# Altium schematic symbol library Semi-ATE.SchLib: 322 symbols (part 2 of 6) (continued)
## CAP_8 (continued)
CAP CER 22UF 10V X5R 0805; 04. Manufacturer: Samsung Electro-Mechanics; 07. Manufacturer  Part Number: CL21A226KPCLRNC; Parameters: X5R, 10V, 10%; POPULATED: yes; 03. Unit Price: 0.36; Tolerance: 10%; 3D-Export: No; 01. Distributor: DigiKey; 02. Distributor Part Number: 1276-6786-6-ND; 09. Operating Temperature: -55°C ~ 85°C; 11. RoHS: YES; Temperature Range: -40°C/+85°C; Type: X5R; Voltage Rating: 10V; ComponentLink4Description: Info; ComponentLink4URL: https://www.digikey.de/products/en/capacitors/ceramic-capacitors/60?k=&pkeyword=&sv=0&pv7=243&sf=1&FV=380004%2C400006%2C1f140000%2Cmu22%C2%B5F%7C2049%2Cffe0003c%2Cc0003&quantity=&ColumnSort=0&page=1&pageSize=25; ComponentLink5Description: DataSheet; ComponentLink5URL: http://www.samsungsem.com/kr/support/product-search/mlcc/CL21A226KPCLRNC.jsp
footprint C0805 (Chip Capacitor; Body 2.0x1.3mm (LxW typ), IPC High Density)
signal-integrity model Cap
simulation model CAP
footprint C1206
footprint C0805 Reflow
pins: 1, 2
2 alternate drawings of the same symbol

## CAP_9
designator C?, comment value 10nF  (hidden comment: C)
CAP CER 10000PF 10V X7R 0402; 04. Manufacturer: KEMET; 07. Manufacturer  Part Number: C0402C103K8RACTU; POPULATED: yes; Parameters: X7R, 10V, 10%; 03. Unit Price: 0.09; Tolerance: 10%; 3D-Export: No; 01. Distributor: DigiKey; 02. Distributor Part Number: 399-7759-6-ND; 09. Operating Temperature: -55°C ~ 125°C; 11. RoHS: YES; Temperature Range: -40°C/+85°C; Type: X7R; Voltage Rating: 10V; ComponentLink4Description: Info; ComponentLink4URL: https://www.digikey.de/product-detail/en/kemet/C0402C103K8RACTU/399-7759-6-ND/3472290; ComponentLink5Description: DataSheet; ComponentLink5URL: https://content.kemet.com/datasheets/KEM_C1002_X7R_SMD.pdf
footprint C0603 (Chip Capacitor; Body 1.6x0.8mm (LxW typ), IPC High Density)
footprint C0805 (Chip Capacitor; Body 2.0x1.3mm (LxW typ), IPC High Density)
footprint C1206 (Chip Capacitor; Body 3.2x1.6mm (LxW typ), IPC High Density)
footprint C1210 (Chip Capacitor; Body 3.2x2.5mm (LxW typ), IPC High Density)
footprint C1812 (Chip Capacitor; Body 4.5x3.2mm (LxW typ), IPC High Density)
footprint C1825 (Chip Capacitor; Body 4.5x6.4mm (LxW typ), IPC High Density)
footprint C0402 (Chip Capacitor; Body 1.0x0.5mm (LxW typ), IPC High Density)
signal-integrity model Cap
simulation model CAP
footprint C0402 RevOne
pins: 1, 2
2 alternate drawings of the same symbol

## CAP_10
designator C?, comment value 1uF  (hidden comment: C)
CAP CER 1UF 25V X5R 0402; 04. Manufacturer: TDK Corporation; 07. Manufacturer  Part Number: CGB2A1X5R1E105K033BC; POPULATED: yes; Parameters: X5R, 25V, 10%; 03. Unit Price: 0.2; Tolerance: 10%; 3D-Export: No; 01. Distributor: DigiKey; 02. Distributor Part Number: 445-13185-6-ND; 09. Operating Temperature: -55°C ~ 85°C; 11. RoHS: YES; Temperature Range: -55°C ~ 85°C; Type: X5R; Voltage Rating: 25V; ComponentLink4Description: Info; ComponentLink4URL: https://www.digikey.de/product-detail/en/tdk-corporation/CGB2A1X5R1E105K033BC/445-13185-6-ND/3959281
footprint C0603 (Chip Capacitor; Body 1.6x0.8mm (LxW typ), IPC High Density)
footprint C0805 (Chip Capacitor; Body 2.0x1.3mm (LxW typ), IPC High Density)
footprint C1206 (Chip Capacitor; Body 3.2x1.6mm (LxW typ), IPC High Density)
footprint C1210 (Chip Capacitor; Body 3.2x2.5mm (LxW typ), IPC High Density)
footprint C1812 (Chip Capacitor; Body 4.5x3.2mm (LxW typ), IPC High Density)
footprint C1825 (Chip Capacitor; Body 4.5x6.4mm (LxW typ), IPC High Density)
footprint C0402 (Chip Capacitor; Body 1.0x0.5mm (LxW typ), IPC High Density)
signal-integrity model Cap
simulation model CAP
footprint C0402 RevOne
pins: 1, 2
2 alternate drawings of the same symbol

## CAP_11
designator C?, comment value 4.7uF  (hidden comment: C)
CAP CER 4.7UF 25V X7R 0805; 04. Manufacturer: TDK Corporation; 07. Manufacturer  Part Number: CGA4J1X7R1E475K125AC; POPULATED: yes; Parameters: X7R, 25V, 10%; 03. Unit Price: 0.5; Tolerance: 10%; 3D-Export: No; 01. Distributor: DigiKey; 02. Distributor Part Number: 445-6967-6-ND; 09. Operating Temperature: -55°C ~ 125°C; 11. RoHS: YES; Temperature Range: -55°C ~ 125°C; Type: X7R; Voltage Rating: 25V; ComponentLink5Description: Info; ComponentLink5URL: https://www.digikey.de/product-detail/en/tdk-corporation/CGA4J1X7R1E475K125AC/445-6967-6-ND/2673110
footprint C0805 (Chip Capacitor; Body 2.0x1.3mm (LxW typ), IPC High Density)
signal-integrity model Cap
simulation model CAP
footprint C0805 Reflow
pins: 1, 2
2 alternate drawings of the same symbol

## CAP_12
designator C?, comment value 100nF  (hidden comment: C)
CAP CER 0.1UF 25V X7R 0603; 04. Manufacturer: Samsung Electro-Mechanics; 07. Manufacturer  Part Number: CL10B104KA8NNNC; POPULATED: yes; Parameters: X7R, 25V, 10%; 03. Unit Price: 0.09; Tolerance: 10%; 3D-Export: No; 01. Distributor: DigiKey; 02. Distributor Part Number: 1276-1006-6-ND; 09. Operating Temperature: -55°C ~ 125°C; 11. RoHS: YES; Temperature Range: -40°C/+85°C; Type: X7R; Voltage Rating: 25V; ComponentLink4Description: Info; ComponentLink4URL: https://www.digikey.de/product-detail/en/samsung-electro-mechanics/CL10B104KA8NNNC/1276-1006-6-ND/3891520; ComponentLink5Description: DataSheet; ComponentLink5URL: https://media.digikey.com/pdf/Data%20Sheets/Samsung%20PDFs/CL_Series_MLCC_ds.pdf
footprint C0402 (Chip Capacitor; Body 1.0x0.5mm (LxW typ), IPC High Density)
footprint C0603 (Chip Capacitor; Body 1.6x0.8mm (LxW typ), IPC High Density)
footprint C0805 (Chip Capacitor; Body 2.0x1.3mm (LxW typ), IPC High Density)
footprint C1206 (Chip Capacitor; Body 3.2x1.6mm (LxW typ), IPC High Density)
footprint C1210 (Chip Capacitor; Body 3.2x2.5mm (LxW typ), IPC High Density)
footprint C1812 (Chip Capacitor; Body 4.5x3.2mm (LxW typ), IPC High Density)
footprint C1825 (Chip Capacitor; Body 4.5x6.4mm (LxW typ), IPC High Density)
signal-integrity model Cap
simulation model CAP
footprint C0603 Reflow
pins: 1, 2
2 alternate drawings of the same symbol

## CAP_13
designator C?, comment value 100nF  (hidden comment: C)
CAP CER 0.1UF 25V X7R 0402; 04. Manufacturer: Yageo; 07. Manufacturer  Part Number: CC0402KRX7R8BB104; POPULATED: yes; Parameters: X7R, 25V, 10%; 03. Unit Price: 0.09; Tolerance: 10%; 3D-Export: No; 01. Distributor: DigiKey; 02. Distributor Part Number: 311-2077-6-ND; 09. Operating Temperature: -55°C ~ 125°C; 11. RoHS: YES; Temperature Range: -40°C/+85°C; Type: X7R; Voltage Rating: 25V
footprint C0402 (Chip Capacitor; Body 1.0x0.5mm (LxW typ), IPC High Density)
footprint C0603 (Chip Capacitor; Body 1.6x0.8mm (LxW typ), IPC High Density)
footprint C0805 (Chip Capacitor; Body 2.0x1.3mm (LxW typ), IPC High Density)
footprint C1206 (Chip Capacitor; Body 3.2x1.6mm (LxW typ), IPC High Density)
footprint C1210 (Chip Capacitor; Body 3.2x2.5mm (LxW typ), IPC High Density)
footprint C1812 (Chip Capacitor; Body 4.5x3.2mm (LxW typ), IPC High Density)
footprint C1825 (Chip Capacitor; Body 4.5x6.4mm (LxW typ), IPC High Density)
signal-integrity model Cap
simulation model CAP
footprint C0402 RevOne
pins: 1, 2
2 alternate drawings of the same symbol

## CAP_14
designator C?, comment value 2.2nF  (hidden comment: C)
CAP CER 2200PF 25V X7R 0603; 04. Manufacturer: KEMET; 07. Manufacturer  Part Number: C0603C222K3RACTU; POPULATED: yes; Parameters: X7R, 25V, 10%; 03. Unit Price: 0.09; Tolerance: 10%; 3D-Export: No; 01. Distributor: DigiKey; 02. Distributor Part Number: 399-9040-6-ND; 09. Operating Temperature: -55°C ~ 125°C; 11. RoHS: YES; Temperature Range: -40°C/+85°C; Type: X7R; Voltage Rating: 25V; ComponentLink4Description: Info; ComponentLink4URL: https://www.digikey.de/product-detail/en/kemet/C0603C222K3RACTU/399-9040-6-ND/3523110
footprint C0402 (Chip Capacitor; Body 1.0x0.5mm (LxW typ), IPC High Density)
footprint C0603 (Chip Capacitor; Body 1.6x0.8mm (LxW typ), IPC High Density)
footprint C0805 (Chip Capacitor; Body 2.0x1.3mm (LxW typ), IPC High Density)
footprint C1206 (Chip Capacitor; Body 3.2x1.6mm (LxW typ), IPC High Density)
footprint C1210 (Chip Capacitor; Body 3.2x2.5mm (LxW typ), IPC High Density)
footprint C1812 (Chip Capacitor; Body 4.5x3.2mm (LxW typ), IPC High Density)
footprint C1825 (Chip Capacitor; Body 4.5x6.4mm (LxW typ), IPC High Density)
signal-integrity model Cap
simulation model CAP
footprint C0603 Reflow
pins: 1, 2
2 alternate drawings of the same symbol

## CAP_15
designator C?, comment value 100nF  (hidden comment: C)
CAP CER 0.1UF 25V X7R 0805; 04. Manufacturer: Yageo; 07. Manufacturer  Part Number: CC0805KRX7R8BB104; POPULATED: yes; Parameters: X7R, 25V, 10%; 03. Unit Price: 0.14; Tolerance: 10%; 3D-Export: No; 01. Distributor: DigiKey; 02. Distributor Part Number: 311-1141-6-ND; 09. Operating Temperature: -55°C ~ 125°C; 11. RoHS: YES; Temperature Range: -40°C/+85°C; Type: X7R; Voltage Rating: 25V; ComponentLink4Description: Info; ComponentLink4URL: https://www.digikey.de/product-detail/en/yageo/CC0805KRX7R8BB104/311-1141-6-ND/578995; ComponentLink5Description: DataSheet; ComponentLink5URL: http://www.yageo.com/documents/recent/UPY-GPHC_X7R_6.3V-to-50V_18.pdf
footprint C0402 (Chip Capacitor; Body 1.0x0.5mm (LxW typ), IPC High Density)
footprint C0603 (Chip Capacitor; Body 1.6x0.8mm (LxW typ), IPC High Density)
footprint C0805 (Chip Capacitor; Body 2.0x1.3mm (LxW typ), IPC High Density)
footprint C1206 (Chip Capacitor; Body 3.2x1.6mm (LxW typ), IPC High Density)
footprint C1210 (Chip Capacitor; Body 3.2x2.5mm (LxW typ), IPC High Density)
footprint C1812 (Chip Capacitor; Body 4.5x3.2mm (LxW typ), IPC High Density)
footprint C1825 (Chip Capacitor; Body 4.5x6.4mm (LxW typ), IPC High Density)
signal-integrity model Cap
simulation model CAP
footprint C0805 Reflow
pins: 1, 2
2 alternate drawings of the same symbol

## CAP_16
designator C?, comment value 47uF  (hidden comment: C)
CAP CER 47UF 10V X5R 1210; MFR-PN: GRM32ER71A476KE15L; MFR: MURATA; MFR-TYPE: GRM series; 04. Manufacturer: Samsung Electro-Mechanics; 07. Manufacturer  Part Number: CL32A476MPJNNNE; POPULATED: yes; Parameters: X7R, 10V, 10%; 03. Unit Price: 0.87; Tolerance: ±20%; Type: X7R; 3D-Export: No; Temperature Range: -55°C ~ 85°C; 01. Distributor: DigiKey; 02. Distributor Part Number: 1276-3380-6-ND; 09. Operating Temperature: -55°C ~ 85°C; 11. RoHS: YES; Voltage Rating: 10V; ComponentLink4Description: Info; ComponentLink4URL: https://www.digikey.de/product-detail/en/samsung-electro-mechanics/CL32A476MPJNNNE/1276-3380-6-ND/3893895; ComponentLink5Description: DataSheet; ComponentLink5URL: http://www.samsungsem.com/kr/support/product-search/mlcc/__icsFiles/afieldfile/2018/08/08/CL32A476MPJNNNE.pdf
footprint C1210 (Chip Capacitor; Body 3.2x2.5mm (LxW typ), IPC High Density)
signal-integrity model Cap
simulation model CAP
pins: 1, 2
2 alternate drawings of the same symbol

## CAP_17
designator C?, comment value 47nF  (hidden comment: C)
CAP CER 0.047UF 25V X7R 0402; 04. Manufacturer: Yageo; 07. Manufacturer  Part Number: CC0402KRX7R8BB473; POPULATED: yes; Parameters: X7R, 25V, 10%; 03. Unit Price: 0.09; Tolerance: 10%; 3D-Export: No; Temperature Range: -40°C/+85°C; 01. Distributor: DigiKey; 02. Distributor Part Number: 311-1717-6-ND; 09. Operating Temperature: -55°C ~ 125°C; 11. RoHS: YES; Type: X7R; Voltage Rating: 25V; ComponentLink4Description: Info; ComponentLink4URL: https://www.digikey.de/product-detail/en/yageo/CC0402KRX7R8BB473/311-1717-6-ND/5196115
footprint C0603 (Chip Capacitor; Body 1.6x0.8mm (LxW typ), IPC High Density)
footprint C0805 (Chip Capacitor; Body 2.0x1.3mm (LxW typ), IPC High Density)
footprint C1206 (Chip Capacitor; Body 3.2x1.6mm (LxW typ), IPC High Density)
footprint C1210 (Chip Capacitor; Body 3.2x2.5mm (LxW typ), IPC High Density)
footprint C1812 (Chip Capacitor; Body 4.5x3.2mm (LxW typ), IPC High Density)
footprint C1825 (Chip Capacitor; Body 4.5x6.4mm (LxW typ), IPC High Density)
footprint C0402 (Chip Capacitor; Body 1.0x0.5mm (LxW typ), IPC High Density)
signal-integrity model Cap
simulation model CAP
footprint C0402 RevOne
pins: 1, 2
2 alternate drawings of the same symbol

## CAP_18
designator C?, comment value 22uF  (hidden comment: C)
CAP CER 22UF 10V X5R 1210; 04. Manufacturer: KEMET; 07. Manufacturer  Part Number: C1210C226K8PACTU; POPULATED: yes; Parameters: X5R, 25V, 10%; 03. Unit Price: 0.71; Tolerance: 10%; Voltage Rating: 25V; 3D-Export: No; Temperature Range: -40°C/+85°C; 01. Distributor: DigiKey; 02. Distributor Part Number: 399-3302-6-ND; 09. Operating Temperature: -55°C ~ 85°C; 11. RoHS: YES; Type: X5R; ComponentLink4Description: Info; ComponentLink4URL: https://www.digikey.de/product-detail/en/kemet/C1210C226K8PACTU/399-3302-6-ND/1787528; ComponentLink5Description: DataSheet; ComponentLink5URL: https://api.kemet.com/component-edge/download/datasheet/C1210C226K8PACTU.pdf
footprint C1210 (Chip Capacitor; Body 3.2x2.5mm (LxW typ), IPC High Density)
signal-integrity model Cap
simulation model CAP
footprint C1206
pins: 1, 2
2 alternate drawings of the same symbol

## CAP_19
designator C?, comment value 22pF  (hidden comment: C)
CAP CER 22PF 50V C0G/NP0 0402; 04. Manufacturer: Samsung Electro-Mechanics; 07. Manufacturer  Part Number: CL05C220JB5NNNC; POPULATED: yes; Parameters: COG, 50V, 5%; 03. Unit Price: 0.09; Tolerance: 5%; Type: COG; 3D-Export: No; Temperature Range: -40°C/+85°C; 01. Distributor: DigiKey; 02. Distributor Part Number: 1276-1116-6-ND; 09. Operating Temperature: -55°C ~ 125°C; Voltage Rating: 50V; ComponentLink4Description: Info; ComponentLink4URL: https://www.digikey.de/products/en?keywords=1276-1116-6-ND; ComponentLink5Description: DataSheet; ComponentLink5URL: https://media.digikey.com/pdf/Data%20Sheets/Samsung%20PDFs/CL_Series_MLCC_ds.pdf
footprint C0603 (Chip Capacitor; Body 1.6x0.8mm (LxW typ), IPC High Density)
footprint C0805 (Chip Capacitor; Body 2.0x1.3mm (LxW typ), IPC High Density)
footprint C1206 (Chip Capacitor; Body 3.2x1.6mm (LxW typ), IPC High Density)
footprint C1210 (Chip Capacitor; Body 3.2x2.5mm (LxW typ), IPC High Density)
footprint C1812 (Chip Capacitor; Body 4.5x3.2mm (LxW typ), IPC High Density)
footprint C1825 (Chip Capacitor; Body 4.5x6.4mm (LxW typ), IPC High Density)
footprint C0402 (Chip Capacitor; Body 1.0x0.5mm (LxW typ), IPC High Density)
signal-integrity model Cap
simulation model CAP
footprint C0402 RevOne
pins: 1, 2
2 alternate drawings of the same symbol

## CAP_20
designator C?, comment value 220pF  (hidden comment: C)
CAP CER 220PF 50V X7R 0402; 04. Manufacturer: Yageo; 07. Manufacturer  Part Number: CC0402JRX7R9BB221; POPULATED: yes; Parameters: X7R, 10V, 5%; 03. Unit Price: 0.09; Tolerance: 5%; 3D-Export: No; Temperature Range: -40°C/+85°C; 01. Distributor: DigiKey; 02. Distributor Part Number: 311-3765-6-ND; 09. Operating Temperature: -55°C ~ 125°C; Type: X7R; Voltage Rating: 50V; ComponentLink4Description: Info; ComponentLink4URL: https://www.digikey.de/product-detail/en/yageo/CC0402FRNPO9BN221/311-3730-6-ND/8025742
footprint C0603 (Chip Capacitor; Body 1.6x0.8mm (LxW typ), IPC High Density)
footprint C0805 (Chip Capacitor; Body 2.0x1.3mm (LxW typ), IPC High Density)
footprint C1206 (Chip Capacitor; Body 3.2x1.6mm (LxW typ), IPC High Density)
footprint C1210 (Chip Capacitor; Body 3.2x2.5mm (LxW typ), IPC High Density)
footprint C1812 (Chip Capacitor; Body 4.5x3.2mm (LxW typ), IPC High Density)
footprint C1825 (Chip Capacitor; Body 4.5x6.4mm (LxW typ), IPC High Density)
footprint C0402 (Chip Capacitor; Body 1.0x0.5mm (LxW typ), IPC High Density)
signal-integrity model Cap
simulation model CAP
footprint C0402 RevOne
pins: 1, 2
2 alternate drawings of the same symbol

## CAP_21
designator C?, comment value 100nF  (hidden comment: C)
CAP CER 0.1UF 25V X7R 1206; 04. Manufacturer: Yageo; 07. Manufacturer  Part Number: AC1206KRX7R8BB104; POPULATED: yes; Parameters: X7R, 25V, 10%; 03. Unit Price: 0.32; Tolerance: 10%; 3D-Export: No; Temperature Range: -40°C/+85°C; 01. Distributor: DigiKey; 02. Distributor Part Number: 311-3229-6-ND; 09. Operating Temperature: -55°C ~ 125°C; 11. RoHS: YES; Type: X7R; Voltage Rating: 25V; ComponentLink4Description: Info; ComponentLink4URL: https://www.digikey.de/product-detail/en/yageo/AC1206KRX7R8BB104/311-3229-6-ND/6643747; ComponentLink5Description: DataSheet; ComponentLink5URL: https://www.digikey.de/products/en/capacitors/ceramic-capacitors/60
footprint C0603 (Chip Capacitor; Body 1.6x0.8mm (LxW typ), IPC High Density)
footprint C0805 (Chip Capacitor; Body 2.0x1.3mm (LxW typ), IPC High Density)
footprint C1206 (Chip Capacitor; Body 3.2x1.6mm (LxW typ), IPC High Density)
footprint C1210 (Chip Capacitor; Body 3.2x2.5mm (LxW typ), IPC High Density)
footprint C1812 (Chip Capacitor; Body 4.5x3.2mm (LxW typ), IPC High Density)
footprint C1825 (Chip Capacitor; Body 4.5x6.4mm (LxW typ), IPC High Density)
footprint C0402 (Chip Capacitor; Body 1.0x0.5mm (LxW typ), IPC High Density)
signal-integrity model Cap
simulation model CAP
footprint C1206 Reflow
pins: 1, 2
2 alternate drawings of the same symbol

## CAP_22
designator C?, comment value 22nF  (hidden comment: C)
CAP CER 0.022UF 50V X7R 0402; 04. Manufacturer: Murata Electronics; 07. Manufacturer  Part Number: GCM155R71H223KA55D; POPULATED: yes; Parameters: X7R, 50V, 10%; 03. Unit Price: 0.1; Tolerance: 10%; 3D-Export: No; Temperature Range: -55°C ~ 125°C; 01. Distributor: DigiKey; 02. Distributor Part Number: 490-4763-6-ND; 09. Operating Temperature: -55°C ~ 125°C; 11. RoHS: YES; Type: X7R; Voltage Rating: 50V; ComponentLink4Description: Info; ComponentLink4URL: https://www.digikey.de/product-detail/en/murata-electronics/GCM155R71H223KA55D/490-4763-6-ND/1641727
footprint C0603 (Chip Capacitor; Body 1.6x0.8mm (LxW typ), IPC High Density)
footprint C0805 (Chip Capacitor; Body 2.0x1.3mm (LxW typ), IPC High Density)
footprint C1206 (Chip Capacitor; Body 3.2x1.6mm (LxW typ), IPC High Density)
footprint C1210 (Chip Capacitor; Body 3.2x2.5mm (LxW typ), IPC High Density)
footprint C1812 (Chip Capacitor; Body 4.5x3.2mm (LxW typ), IPC High Density)
footprint C1825 (Chip Capacitor; Body 4.5x6.4mm (LxW typ), IPC High Density)
footprint C0402 (Chip Capacitor; Body 1.0x0.5mm (LxW typ), IPC High Density)
signal-integrity model Cap
simulation model CAP
footprint C0402 RevOne
pins: 1, 2
2 alternate drawings of the same symbol

## CAP_23
designator C?, comment value 10uF  (hidden comment: C)
CAP CER 10UF 25V X7R 1206; 04. Manufacturer: TDK Corporation; 07. Manufacturer  Part Number: C3216X7R1E106K160AB; POPULATED: yes; Parameters: X7R, 25V, 10%; 03. Unit Price: 0.65; Tolerance: 10%; 3D-Export: No; 01. Distributor: DigiKey; 02. Distributor Part Number: 445-7705-6-ND; 09. Operating Temperature: -55°C ~ 125°C; 11. RoHS: YES; Temperature Range: -40°C/+85°C; Type: X7R; Voltage Rating: 25V; ComponentLink4Description: DataSheet; ComponentLink4URL: https://www.digikey.de/product-detail/en/tdk-corporation/C3216X7R1E475K160AC/445-1606-6-ND/1725789; ComponentLink5Description: Info; ComponentLink5URL: https://product.tdk.com/info/en/catalog/datasheets/mlcc_commercial_general_en.pdf
footprint C1206 (Chip Capacitor; Body 3.2x1.6mm (LxW typ), IPC High Density)
signal-integrity model Cap
simulation model CAP
footprint C0805
footprint C1206 Reflow
pins: 1, 2
2 alternate drawings of the same symbol

## CAP_24
designator C?, comment value 1nF  (hidden comment: C)
CAP CER 1000PF 25V X7R 0402; 04. Manufacturer: KEMET; 07. Manufacturer  Part Number: C0402C102K3RACTU; POPULATED: yes; Parameters: X7R, 25V, 10%; 03. Unit Price: 0.09; Tolerance: 10%; 3D-Export: No; 01. Distributor: DigiKey; 02. Distributor Part Number: 399-1031-6-ND; 09. Operating Temperature: -55°C ~ 125°C; 11. RoHS: YES; Temperature Range: -40°C/+85°C; Type: X7R; Voltage Rating: 25V; ComponentLink4Description: Info; ComponentLink4URL: https://www.digikey.de/product-detail/en/kemet/C0402C102K3RACTU/399-1031-6-ND/574583; ComponentLink5Description: DataSheet; ComponentLink5URL: https://content.kemet.com/datasheets/KEM_C1002_X7R_SMD.pdf
footprint C0603 (Chip Capacitor; Body 1.6x0.8mm (LxW typ), IPC High Density)
footprint C0805 (Chip Capacitor; Body 2.0x1.3mm (LxW typ), IPC High Density)
footprint C1206 (Chip Capacitor; Body 3.2x1.6mm (LxW typ), IPC High Density)
footprint C1210 (Chip Capacitor; Body 3.2x2.5mm (LxW typ), IPC High Density)
footprint C1812 (Chip Capacitor; Body 4.5x3.2mm (LxW typ), IPC High Density)
footprint C1825 (Chip Capacitor; Body 4.5x6.4mm (LxW typ), IPC High Density)
footprint C0402 (Chip Capacitor; Body 1.0x0.5mm (LxW typ), IPC High Density)
signal-integrity model Cap
simulation model CAP
footprint C0402 RevOne
pins: 1, 2
2 alternate drawings of the same symbol

## CAP_25
designator C?, comment value 100pF  (hidden comment: C)
CAP CER 100PF 25V C0G/NP0 0402; 04. Manufacturer: KEMET; 07. Manufacturer  Part Number: C0402C101J3GACTU; POPULATED: yes; Parameters: COG, 25V, 5%; 03. Unit Price: 0.09; Tolerance: 5%; Type: COG; 3D-Export: No; 01. Distributor: DigiKey; 02. Distributor Part Number: 399-1022-6-ND; 09. Operating Temperature: -55°C ~ 125°C; 11. RoHS: YES; Temperature Range: -40°C/+85°C; Voltage Rating: 25V; ComponentLink4Description: Info; ComponentLink4URL: https://www.digikey.de/product-detail/en/kemet/C0402C101J3GACTU/399-1022-6-ND/574581; ComponentLink5Description: DataSheet; ComponentLink5URL: https://content.kemet.com/datasheets/KEM_C1003_C0G_SMD.pdf
footprint C0603 (Chip Capacitor; Body 1.6x0.8mm (LxW typ), IPC High Density)
footprint C0805 (Chip Capacitor; Body 2.0x1.3mm (LxW typ), IPC High Density)
footprint C1206 (Chip Capacitor; Body 3.2x1.6mm (LxW typ), IPC High Density)
footprint C1210 (Chip Capacitor; Body 3.2x2.5mm (LxW typ), IPC High Density)
footprint C1812 (Chip Capacitor; Body 4.5x3.2mm (LxW typ), IPC High Density)
footprint C1825 (Chip Capacitor; Body 4.5x6.4mm (LxW typ), IPC High Density)
footprint C0402 (Chip Capacitor; Body 1.0x0.5mm (LxW typ), IPC High Density)
signal-integrity model Cap
simulation model CAP
footprint C0402 RevOne
pins: 1, 2
2 alternate drawings of the same symbol

## CAP_26
designator C?, comment value 2.2pF  (hidden comment: C)
CAP CER 2.2PF 10V C0G/NP0 0402; 04. Manufacturer: Würth Elektronik; 07. Manufacturer  Part Number: 885012005003; POPULATED: yes; Parameters: COG, 25V, 5%; 03. Unit Price: 0.1; Tolerance: 5%; Type: COG; Voltage Rating: 25V; 3D-Export: No; 01. Distributor: DigiKey; 02. Distributor Part Number: 732-7421-6-ND; 09. Operating Temperature: -55°C ~ 125°C; 11. RoHS: YES; Temperature Range: -55°C ~ 125°C; ComponentLink4Description: Info; ComponentLink4URL: https://www.digikey.de/product-detail/en/w-rth-elektronik/885012005003/732-7421-6-ND/5454820
footprint C0402 (Chip Capacitor; Body 1.0x0.5mm (LxW typ), IPC High Density)
footprint C0805 (Chip Capacitor; Body 2.0x1.3mm (LxW typ), IPC High Density)
footprint C1206 (Chip Capacitor; Body 3.2x1.6mm (LxW typ), IPC High Density)
footprint C1210 (Chip Capacitor; Body 3.2x2.5mm (LxW typ), IPC High Density)
footprint C1812 (Chip Capacitor; Body 4.5x3.2mm (LxW typ), IPC High Density)
footprint C1825 (Chip Capacitor; Body 4.5x6.4mm (LxW typ), IPC High Density)
footprint C0402 (Chip Capacitor; Body 1.0x0.5mm (LxW typ), IPC High Density)
signal-integrity model Cap
simulation model CAP
footprint C0201 Reflow
footprint C0402 Reflow
pins: 1, 2
2 alternate drawings of the same symbol

## CAP_27
designator C?, comment value 5.1pF  (hidden comment: C)
CAP CER 5.1PF 25V C0G/NP0 0402; 04. Manufacturer: KEMET; 07. Manufacturer  Part Number: C0402C519D3GAC7867; POPULATED: yes; 03. Unit Price: 0.37; 5%: 10%; Type: COG; 3D-Export: No; 01. Distributor: DigiKey; 02. Distributor Part Number: 399-14919-6-ND; 09. Operating Temperature: -55°C ~ 125°C; 11. RoHS: YES; Temperature Range: -40°C/+85°C; Voltage Rating: 25V; ComponentLink4Description: Info; ComponentLink4URL: https://www.digikey.de/product-detail/en/kemet/C0402C103K8RACTU/399-7759-6-ND/3472290; ComponentLink5Description: DataSheet; ComponentLink5URL: https://content.kemet.com/datasheets/KEM_C1002_X7R_SMD.pdf
footprint C0402 (Chip Capacitor; Body 1.0x0.5mm (LxW typ), IPC High Density)
footprint C0805 (Chip Capacitor; Body 2.0x1.3mm (LxW typ), IPC High Density)
footprint C1206 (Chip Capacitor; Body 3.2x1.6mm (LxW typ), IPC High Density)
footprint C1210 (Chip Capacitor; Body 3.2x2.5mm (LxW typ), IPC High Density)
footprint C1812 (Chip Capacitor; Body 4.5x3.2mm (LxW typ), IPC High Density)
footprint C1825 (Chip Capacitor; Body 4.5x6.4mm (LxW typ), IPC High Density)
footprint C0603 (Chip Capacitor; Body 1.6x0.8mm (LxW typ), IPC High Density)
signal-integrity model Cap
simulation model CAP
footprint C0402 RevOne
pins: 1, 2
2 alternate drawings of the same symbol

## CAP_28
designator C?, comment value 22uF  (hidden comment: C)
CAP CER 22UF 25V X5R 1210; 04. Manufacturer: KEMET; 07. Manufacturer  Part Number: C1210C226K3PAC7210; POPULATED: yes; Parameters: X5R, 25V, 10%; 03. Unit Price: 2.27; Tolerance: 10%; 3D-Export: No; 01. Distributor: Mouser; 02. Distributor Part Number: 80-C1210C226K3P7210; 09. Operating Temperature: -55°C ~ 85°C; 11. RoHS: YES; Temperature Range: -40°C/+85°C; Type: X5R; Voltage Rating: 25V; ComponentLink4Description: Info; ComponentLink4URL: https://www.digikey.de/product-detail/en/kemet/C1210C226K8PACTU/399-3302-6-ND/1787528; ComponentLink5Description: DataSheet; ComponentLink5URL: https://api.kemet.com/component-edge/download/datasheet/C1210C226K8PACTU.pdf
footprint C1210 (Chip Capacitor; Body 3.2x2.5mm (LxW typ), IPC High Density)
signal-integrity model Cap
simulation model CAP
footprint C1206
pins: 1, 2
2 alternate drawings of the same symbol

## CAP_29
designator C?, comment value 33pF  (hidden comment: C)
CAP CER 33PF 10V C0G/NP0 0402; 04. Manufacturer: KEMET; 07. Manufacturer  Part Number: C0402C330J8GAC7867; POPULATED: yes; Parameters: COG, 10V, 5%; 03. Unit Price: 0.32; Tolerance: 5%; Type: C0G, NP0; 3D-Export: No; 01. Distributor: DigiKey; 02. Distributor Part Number: 399-14904-6-ND; 09. Operating Temperature: -55°C ~ 125°C; 11. RoHS: YES; Temperature Range: -55°C ~ 125°C; Voltage Rating: 10V; ComponentLink4Description: Info; ComponentLink4URL: https://www.digikey.de/product-detail/en/kemet/C0402C103K8RACTU/399-7759-6-ND/3472290; ComponentLink5Description: DataSheet; ComponentLink5URL: https://content.kemet.com/datasheets/KEM_C1002_X7R_SMD.pdf
footprint C0402 (Chip Capacitor; Body 1.0x0.5mm (LxW typ), IPC High Density)
footprint C0805 (Chip Capacitor; Body 2.0x1.3mm (LxW typ), IPC High Density)
footprint C1206 (Chip Capacitor; Body 3.2x1.6mm (LxW typ), IPC High Density)
footprint C1210 (Chip Capacitor; Body 3.2x2.5mm (LxW typ), IPC High Density)
footprint C1812 (Chip Capacitor; Body 4.5x3.2mm (LxW typ), IPC High Density)
footprint C1825 (Chip Capacitor; Body 4.5x6.4mm (LxW typ), IPC High Density)
footprint C0603 (Chip Capacitor; Body 1.6x0.8mm (LxW typ), IPC High Density)
signal-integrity model Cap
simulation model CAP
footprint C0402 RevOne
pins: 1, 2
2 alternate drawings of the same symbol

## CAP_30
designator C?, comment value 1uF  (hidden comment: C)
CAP CER 1UF 10V X7R 0805; 04. Manufacturer: KEMET; 07. Manufacturer  Part Number: C0805X105K3RAC3316; POPULATED: yes; Parameters: X7R, 25V, 10%; 03. Unit Price: 0.33; Tolerance: 10%; Voltage Rating: 25V; 3D-Export: No; 01. Distributor: Mouser; 02. Distributor Part Number: 80-C0805X105K3R3316; 09. Operating Temperature: -55°C ~ 125°C; 11. RoHS: YES; Temperature Range: -40°C/+85°C; Type: X7R; ComponentLink4Description: Info; ComponentLink4URL: https://www.digikey.de/product-detail/en/samsung-electro-mechanics/CL21B105KPFNNNE/1276-1275-6-ND/3891789; ComponentLink5Description: DataSheet; ComponentLink5URL: https://media.digikey.com/pdf/Data%20Sheets/Samsung%20PDFs/CL_Series_MLCC_ds.pdf
footprint C0805 (Chip Capacitor; Body 2.0x1.3mm (LxW typ), IPC High Density)
signal-integrity model Cap
simulation model CAP
footprint C0603
footprint C0805 Reflow
pins: 1, 2
2 alternate drawings of the same symbol

## CAP_31
designator C?, comment value 22pF  (hidden comment: C)
CAP CER 22PF 50V C0G/NP0 0402; 04. Manufacturer: Samsung Electro-Mechanics; 07. Manufacturer  Part Number: CL05C220JB5NNNC; POPULATED: yes; Parameters: COG, 50V, 5%; 03. Unit Price: 0.09; Tolerance: 5%; Type: COG; 3D-Export: No; Temperature Range: -40°C/+85°C; 01. Distributor: DigiKey; 02. Distributor Part Number: 1276-1116-6-ND; 09. Operating Temperature: -55°C ~ 125°C; Voltage Rating: 50V
footprint C0603 (Chip Capacitor; Body 1.6x0.8mm (LxW typ), IPC High Density)
footprint C0805 (Chip Capacitor; Body 2.0x1.3mm (LxW typ), IPC High Density)
footprint C1206 (Chip Capacitor; Body 3.2x1.6mm (LxW typ), IPC High Density)
footprint C1210 (Chip Capacitor; Body 3.2x2.5mm (LxW typ), IPC High Density)
footprint C1812 (Chip Capacitor; Body 4.5x3.2mm (LxW typ), IPC High Density)
footprint C1825 (Chip Capacitor; Body 4.5x6.4mm (LxW typ), IPC High Density)
footprint C0402 (Chip Capacitor; Body 1.0x0.5mm (LxW typ), IPC High Density)
signal-integrity model Cap
simulation model CAP
footprint C0402 RevOne
pins: 1, 2
2 alternate drawings of the same symbol

## CAP_32
designator C?, comment value 2u2F  (hidden comment: C)
CAP CER 2.2UF 6.3V X7R 0603; 04. Manufacturer: Samsung Electro-Mechanics; 07. Manufacturer  Part Number: CL10B225KQ8NFNC; POPULATED: yes; Parameters: X7R, 6V3, 10%; 03. Unit Price: 0.12; Tolerance: 10%; Voltage Rating: 6V3; 3D-Export: No; Temperature Range: -40°C/+85°C; 01. Distributor: DigiKey; 02. Distributor Part Number: 1276-2017-6-ND; 09. Operating Temperature: -55°C ~ 125°C; 11. RoHS: YES; Type: X7R
footprint C0603 (Chip Capacitor; Body 1.6x0.8mm (LxW typ), IPC High Density)
footprint C0805 (Chip Capacitor; Body 2.0x1.3mm (LxW typ), IPC High Density)
footprint C1206 (Chip Capacitor; Body 3.2x1.6mm (LxW typ), IPC High Density)
footprint C1210 (Chip Capacitor; Body 3.2x2.5mm (LxW typ), IPC High Density)
footprint C1812 (Chip Capacitor; Body 4.5x3.2mm (LxW typ), IPC High Density)
footprint C1825 (Chip Capacitor; Body 4.5x6.4mm (LxW typ), IPC High Density)
footprint C0402 (Chip Capacitor; Body 1.0x0.5mm (LxW typ), IPC High Density)
signal-integrity model Cap
simulation model CAP
footprint C0603 Reflow
pins: 1, 2
2 alternate drawings of the same symbol

## CAP_33
designator C?, comment value 22p  (hidden comment: C)
CAP CER 22PF 25V C0G/NP0 0402; 04. Manufacturer: Walsin Technology Corporation; 07. Manufacturer  Part Number: 0402N220J250CT; POPULATED: yes; Parameters: COG, 25V, 5%; 03. Unit Price: 0.09; 08. Inhouse Stock: -55°C ~ 125°C; Tolerance: 5%; Type: COG; 3D-Export: No; Temperature Range: -55°C ~ 125°C; 01. Distributor: DigiKey; 02. Distributor Part Number: 1292-1282-6-ND; 11. RoHS: YES; Voltage Rating: 25V; ComponentLink4Description: Info; ComponentLink4URL: https://www.digikey.de/product-detail/en/walsin-technology-corporation/0402N220J250CT/1292-1282-6-ND/9355821
footprint C0603 (Chip Capacitor; Body 1.6x0.8mm (LxW typ), IPC High Density)
footprint C0805 (Chip Capacitor; Body 2.0x1.3mm (LxW typ), IPC High Density)
footprint C1206 (Chip Capacitor; Body 3.2x1.6mm (LxW typ), IPC High Density)
footprint C1210 (Chip Capacitor; Body 3.2x2.5mm (LxW typ), IPC High Density)
footprint C1812 (Chip Capacitor; Body 4.5x3.2mm (LxW typ), IPC High Density)
footprint C1825 (Chip Capacitor; Body 4.5x6.4mm (LxW typ), IPC High Density)
footprint C0402 (Chip Capacitor; Body 1.0x0.5mm (LxW typ), IPC High Density)
signal-integrity model Cap
simulation model CAP
footprint C0402 RevOne
pins: 1, 2
2 alternate drawings of the same symbol

## CAP_34
designator C?, comment value 220nF  (hidden comment: C)
CAP CER 0.22UF 25V X7R 0402; MFR-PN: C1005X7R1E224K050BB; MFR: TDK; 04. Manufacturer: TDK Corporation; 07. Manufacturer  Part Number: CGA2B3X7R1E224K050BB; POPULATED: yes; Parameters: X7R, 25V, 10%; 03. Unit Price: 0.2; Tolerance: 10%; 3D-Export: No; 01. Distributor: DigiKey; 02. Distributor Part Number: 445-174424-6-ND; 09. Operating Temperature: -55°C ~ 125°C; 11. RoHS: YES; Temperature Range: -40°C/+85°C; Type: X7R; Voltage Rating: 25V; ComponentLink4Description: Info; ComponentLink4URL: https://www.digikey.de/product-detail/en/tdk-corporation/CGA2B3X7R1E224K050BB/445-174424-6-ND/5880197; ComponentLink5Description: DataSheet; ComponentLink5URL: https://product.tdk.com/info/en/catalog/datasheets/mlcc_automotive_general_en.pdf
footprint C0402 (Chip Capacitor; Body 1.0x0.5mm (LxW typ), IPC High Density)
footprint C0603 (Chip Capacitor; Body 1.6x0.8mm (LxW typ), IPC High Density)
footprint C0805 (Chip Capacitor; Body 2.0x1.3mm (LxW typ), IPC High Density)
footprint C1206 (Chip Capacitor; Body 3.2x1.6mm (LxW typ), IPC High Density)
footprint C1210 (Chip Capacitor; Body 3.2x2.5mm (LxW typ), IPC High Density)
footprint C1812 (Chip Capacitor; Body 4.5x3.2mm (LxW typ), IPC High Density)
footprint C1825 (Chip Capacitor; Body 4.5x6.4mm (LxW typ), IPC High Density)
signal-integrity model Cap
simulation model CAP
footprint C0402 RevOne
pins: 1, 2
2 alternate drawings of the same symbol

## CAP_35
designator C?, comment value 27pF  (hidden comment: C)
CAP CER 27PF 10V C0G/NP0 0402; 04. Manufacturer: Vishay Vitramon; 07. Manufacturer  Part Number: VJ0402A270JXQPW1BC; POPULATED: yes; Parameters: COG, 10V, 5%; 03. Unit Price: 0.09; Tolerance: 5%; Type: COG; 3D-Export: No; 01. Distributor: DigiKey; 02. Distributor Part Number: VJ0402A270JXQPW1BC-ND; 09. Operating Temperature: -55°C ~ 125°C; 11. RoHS: YES; Temperature Range: -55°C ~ 125°C; Voltage Rating: 10V; ComponentLink4Description: Info; ComponentLink4URL: https://www.digikey.de/product-detail/en/vishay-vitramon/VJ0402A270JXQPW1BC/VJ0402A270JXQPW1BC-ND/8301195; ComponentLink5Description: DataSheet; ComponentLink5URL: https://www.vishay.com/docs/28548/vjw1bcbascomseries.pdf
footprint C0402 (Chip Capacitor; Body 1.0x0.5mm (LxW typ), IPC High Density)
footprint C0603 (Chip Capacitor; Body 1.6x0.8mm (LxW typ), IPC High Density)
footprint C0805 (Chip Capacitor; Body 2.0x1.3mm (LxW typ), IPC High Density)
footprint C1206 (Chip Capacitor; Body 3.2x1.6mm (LxW typ), IPC High Density)
footprint C1210 (Chip Capacitor; Body 3.2x2.5mm (LxW typ), IPC High Density)
footprint C1812 (Chip Capacitor; Body 4.5x3.2mm (LxW typ), IPC High Density)
footprint C1825 (Chip Capacitor; Body 4.5x6.4mm (LxW typ), IPC High Density)
signal-integrity model Cap
simulation model CAP
footprint C0402 RevOne
pins: 1, 2
2 alternate drawings of the same symbol

## CAP_36
designator C?, comment value 22uF  (hidden comment: C)
CAP CER 22UF 10V X5R 1206; 04. Manufacturer: Samsung Electro-Mechanics; 07. Manufacturer  Part Number: CL31A226KPHNNNE; POPULATED: yes; Parameters: X5R, 10V, 10%; 03. Unit Price: 0.36; Tolerance: 10%; 3D-Export: No; 01. Distributor: DigiKey; 02. Distributor Part Number: 1276-1287-6-ND; 09. Operating Temperature: -55°C ~ 85°C; 11. RoHS: YES; Temperature Range: -40°C/+85°C; Type: X5R; Voltage Rating: 10V; ComponentLink4Description: Info; ComponentLink4URL: https://www.digikey.de/product-detail/en/samsung-electro-mechanics/CL31A226KPHNNNE/1276-1287-6-ND/3891801; ComponentLink5Description: DataSheet; ComponentLink5URL: http://www.samsungsem.com/kr/support/product-search/mlcc/__icsFiles/afieldfile/2018/06/21/CL31A226KPHNNNE.pdf
footprint C0603 (Chip Capacitor; Body 1.6x0.8mm (LxW typ), IPC High Density)
footprint C0805 (Chip Capacitor; Body 2.0x1.3mm (LxW typ), IPC High Density)
footprint C1206 (Chip Capacitor; Body 3.2x1.6mm (LxW typ), IPC High Density)
footprint C1210 (Chip Capacitor; Body 3.2x2.5mm (LxW typ), IPC High Density)
footprint C1812 (Chip Capacitor; Body 4.5x3.2mm (LxW typ), IPC High Density)
footprint C1825 (Chip Capacitor; Body 4.5x6.4mm (LxW typ), IPC High Density)
footprint C0402 (Chip Capacitor; Body 1.0x0.5mm (LxW typ), IPC High Density)
signal-integrity model Cap
simulation model CAP
footprint C1206 Reflow
pins: 1, 2
2 alternate drawings of the same symbol

## CDCLVC1106
designator U?, comment NicName: CDCLVC1106  (hidden comment: U)
IC CLK BUFFER 1:6 250MHZ 14TSSOP; 04. Manufacturer: Texas Instruments; 07. Manufacturer  Part Number: CDCLVC1106PWR; 03. Unit Price: 3.15; 13. Created Date/Name: AUG 2018 / Hören; 3D-Export: No; 01. Distributor: DigiKey; 02. Distributor Part Number: 296-27588-6-ND; 09. Operating Temperature: -40°C ~ 85°C; 11. RoHS: YES; ComponentLink1Description: Info; ComponentLink1URL: https://www.digikey.de/product-detail/en/texas-instruments/CDCLVC1106PWR/296-27588-6-ND/2336543; ComponentLink2Description: DataSheet; ComponentLink2URL: http://www.ti.com/lit/ds/symlink/cdclvc1104.pdf; Package: TSSOP14
footprint TSSOP14(R-PDSO-G14)
part A pins: 1 IN, 3 Y0, 6 Y4, 9 Y5, 11 Y2, 13 Y3, 14 Y1
part B pins: 2 OE, 4 GND, 5 VDD, 7 GND, 8 VDD, 10 GND, 12 VDD

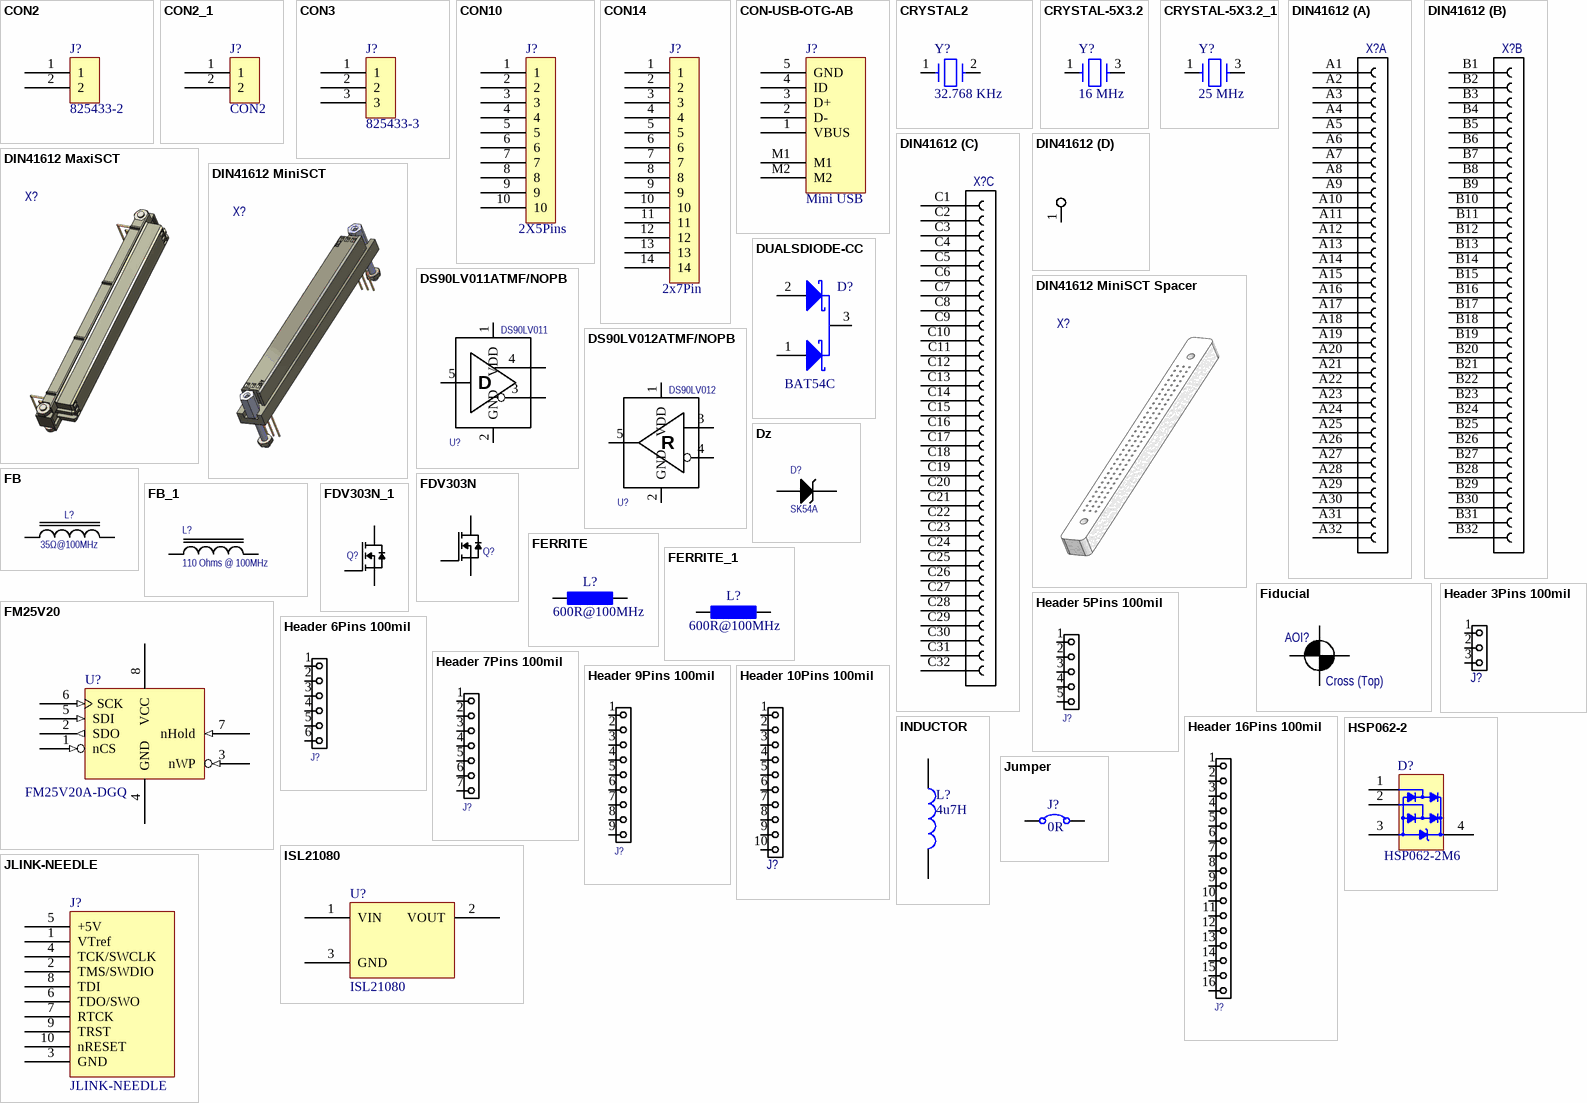
[diagram p7: symbols CON2 to Jumper]

## CON2
designator J?, comment 07. Manufacturer  Part Number: 825433-2  (hidden comment: J)
CONN HEADER VERT 2POS 2.54MM; MFR: TYCO; 04. Manufacturer: TE Connectivity AMP Connectors; POPULATED: no; 03. Unit Price: 0.39; 3D-Export: No; MFR-PN: 825433-2; 01. Distributor: DigiKey; 02. Distributor Part Number: A106464-ND; 09. Operating Temperature: -65°C ~ 105°C; 11. RoHS: YES; ComponentLink4Description: Info; ComponentLink4URL: https://www.digikey.de/products/en/connectors-interconnects/rectangular-connectors-headers-male-pins/314?k=825433-2&k=&pkeyword=825433-2&sv=0&pv88=2&sf=0&quantity=&ColumnSort=0&page=1&pageSize=25; ComponentLink5Description: DataSheet; ComponentLink5URL: https://www.te.com/commerce/DocumentDelivery/DDEController?Action=srchrtrv&DocNm=825433&DocType=Customer+Drawing&DocLang=English
footprint HDR1X2
footprint TSW-1X2
pins: 1, 2